# Altium footprint library ZYF_Common.PcbLib: 66 footprints (part 1 of 5)
Each footprint in its own frame and in the unit in brackets; x right, y up, seen from the top. Pads: shape width x height; smd on the part's side, far side on the other; paste and mask are expansions set on the pad; w line width, h text height; cw(c..) or ccw(c..) is an arc to the next point about the centre after c.
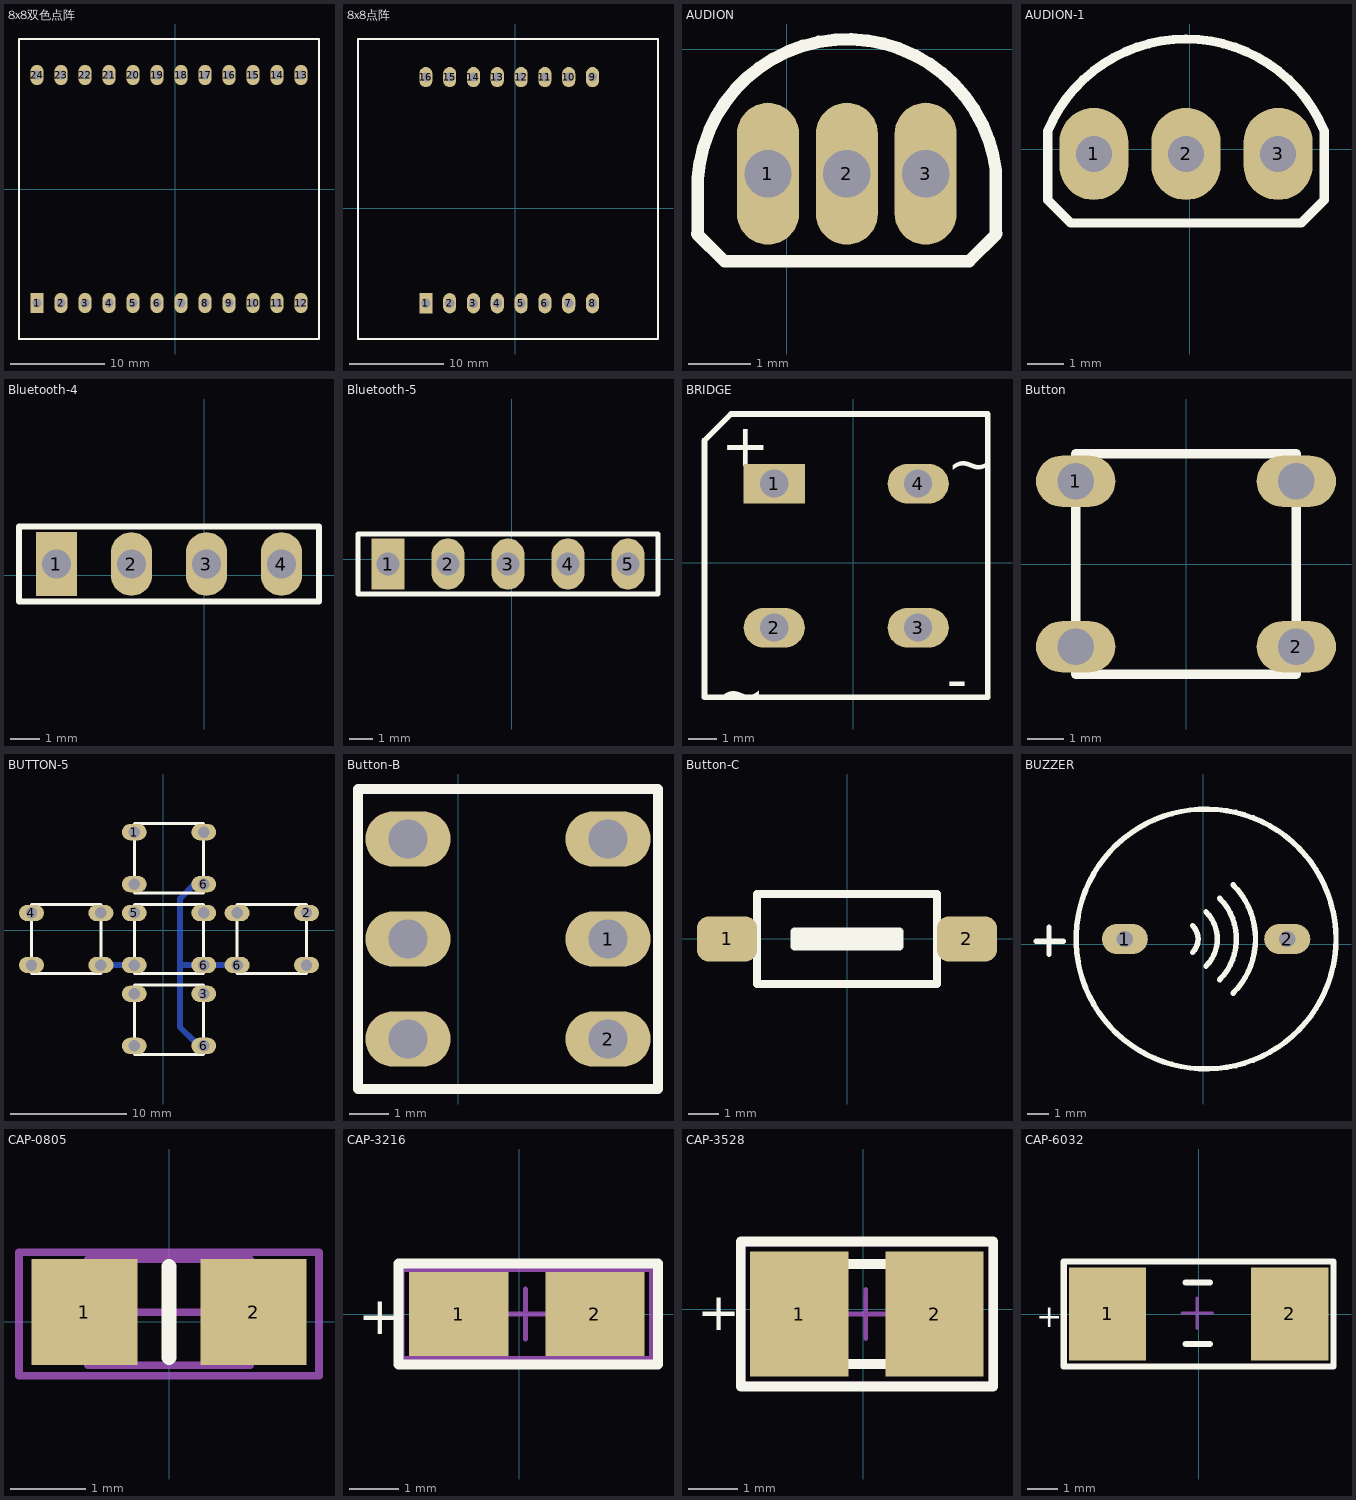
[diagram p0: the footprints below, top view; thin cyan lines are the x and y axes]

## 8x8双色点阵 [mil]
pads (24):
  rect 55x85 hole 39: 1(-575,-475)
  oval 55x85 hole 39: 2(-475,-475) 3(-375,-475) 4(-275,-475) 5(-175,-475) 6(-75,-475) 7(25,-475) 8(125,-475) 9(225,-475) 10(325,-475) 11(425,-475) 12(525,-475) 13(525,475) 14(425,475) 15(325,475) 16(225,475) 17(125,475) 18(25,475) 19(-75,475) 20(-175,475) 21(-275,475) 22(-375,475) 23(-475,475) 24(-575,475)
Top Overlay:
  lines w10: -650,-625 600,-625 600,625 -650,625 -650,-625
3D body: height 315, standoff -128, extent -657,-628.5 600,628.5

## 8x8点阵 [mil]
pads (16):
  rect 55x85 hole 39: 1(-375,-400)
  oval 55x85 hole 39: 2(-275,-400) 3(-175,-400) 4(-75,-400) 5(25,-400) 6(125,-400) 7(225,-400) 8(325,-400) 9(325,550) 10(225,550) 11(125,550) 12(25,550) 13(-75,550) 14(-175,550) 15(-275,550) 16(-375,550)
Top Overlay:
  lines w10: -660,-550 -660,710 600,710 600,-550 -660,-550
3D body: height 315, standoff -128, extent -657,-550 600,707

## AUDION [mil]
pads (3):
  oval 39.37x90 hole 30: 1(-12,-79) 2(38,-79) 3(88,-79)
Top Overlay:
  lines w7.85: -56.49,-82 cw(c38.24,-88.69) 132.49,-77
  lines w7.87: -56.88,-117.19 -39.56,-134.51 115.56,-134.51 132.88,-117.19 ; -56.49,-117.19 -56.49,-82 ; 132.49,-117.19 132.49,-77
3D body: height 189.96, standoff -578.74, extent -55.7,-135.91 131.7,7

## AUDION-1 [mil]
pads (3):
  oval 75x100 hole 39: 1(-104,-5) 2(-4,-5) 3(96,-5)
Top Overlay:
  lines w10: -154,-55 -129,-80 121,-80 146,-55 146,20 ccw(c-4,-43.15) -154,20 -154,-55
3D body: height 189.96, standoff -578.74, extent -97.7,-66.91 89.7,76

## Bluetooth-4 [mil]
pads (4):
  rect 55x85 hole 39: 1(-197,15)
  oval 55x85 hole 39: 2(-97,15) 3(3,15) 4(103,15)
Top Overlay:
  lines w7.87: -247,-35 153,-35 153,65 -247,65 -247,-35
3D body: height 322.83, standoff -118.11, extent -247,-33.36 153,65

## Bluetooth-5 [mil]
pads (5):
  rect 55x85 hole 39: 1(-206,-8)
  oval 55x85 hole 39: 2(-106,-8) 3(-6,-8) 4(94,-8) 5(194,-8)
Top Overlay:
  lines w7.87: -256,-58 244,-58 244,42 -256,42 -256,-58
3D body: height 322.83, standoff -118.11, extent -252.05,-57.04 247.94,41.32

## BRIDGE [mil]
pads (4):
  rect 85x55 hole 39: 1(-110,110)
  oval 85x55 hole 39: 2(-110,-90) 3(90,-90) 4(90,110)
Top Overlay:
  lines w7.87: -206.85,-186.85 -206.85,170 -170,206.85 186.85,206.85 186.85,-186.85 -206.85,-186.85
  text "+" at -183.62,134.57 h59.06
  text "-" at 130,-190 h59.05
  text "~" at -190,-210 h59.05
  text "~" at 130,110 h59.05

## Button [mil]
pads (4):
  oval 85x55 hole 39: 1(-118.11,88.58) 2(118.11,-88.58) ""(-118.11,-88.58) ""(118.11,88.58)
Top Overlay:
  lines w10: -118.11,-118.11 118.11,-118.11 118.11,118.11 -118.11,118.11 -118.11,-118.11
3D body: height 197.24, standoff -138.19, extent -152.41,-118.7 152.43,118.7

## BUTTON-5 [mil]
pads (20):
  oval 85x55 hole 39: 1(-99.18,333.45) 2(487.04,58.45) 3(137.04,-216.55) 4(-449.18,58.45) 5(-99.18,58.45) 6(137.04,-393.71) 6(137.04,-118.71) 6(137.04,156.29) 6(250.82,-118.71) ""(-449.18,-118.71) ""(-212.96,-118.71) ""(-212.96,58.45) ""(-99.18,-393.71) ""(-99.18,-216.55) ""(-99.18,-118.71) ""(-99.18,156.29) ""(137.04,58.45) ""(137.04,333.45) ""(250.82,58.45) ""(487.04,-118.71)
Bottom Layer:
  lines w20: -212.96,-118.71 -102.48,-118.71 ; 56.43,-180.13 56.43,107.37 105.35,156.29 137.04,156.29 ; 106.43,-380.13 56.43,-330.13 56.43,-118.71 137.04,-118.71 237.52,-118.71 ; 107.52,58.45 137.04,58.45
Top Overlay:
  lines w10: -449.18,-148.24 -449.18,87.98 -212.96,87.98 -212.96,-148.24 -449.18,-148.24 ; -99.18,-423.24 -99.18,-187.02 137.04,-187.02 137.04,-423.24 -99.18,-423.24 ; -99.18,-148.24 137.04,-148.24 137.04,87.98 -99.18,87.98 -99.18,-148.24 ; -99.18,126.76 -99.18,362.98 137.04,362.98 137.04,126.76 -99.18,126.76 ; 250.82,-148.24 250.82,87.98 487.04,87.98 487.04,-148.24 250.82,-148.24
3D body: height 197.24, standoff -138.19, extent -133.48,126.17 171.36,363.57
3D body: height 197.24, standoff -138.19, extent -133.48,-423.83 171.36,-186.43
3D body: height 197.24, standoff -138.19, extent -483.48,-148.83 -178.64,88.57
3D body: height 197.24, standoff -138.19, extent 216.52,-148.83 521.36,88.57
3D body: height 197.24, standoff -138.19, extent -133.48,-148.83 171.36,88.57

## Button-B [mil]
pads (6):
  oval 85x55 hole 39: 1(150,225) 2(150,125) ""(-50,125) ""(-50,225) ""(-50,325) ""(150,325)
Top Overlay:
  lines w10: -100,75 200,75 200,375 -100,375 -100,75
3D body: height 511.81, standoff -157.48, extent -87.79,87.21 187.8,362.8

## Button-C [mm]
pads (2):
  rrect50% 2x1.5 smd: 1(-4,0) 2(4,0)
Top Overlay:
  lines w0.254: -1.75,0 1.75,0 ; -3,-1.5 3,-1.5 3,1.5 -3,1.5 -3,-1.5 ; -1.75,-0.25 1.75,-0.25 1.75,0.25 -1.75,0.25 -1.75,-0.25
3D body: height 2.5, standoff -0.1, extent -4,-1.8 4,1.8

## BUZZER [mil]
pads (2):
  oval 85x55 hole 30: 1(-145,10) 2(155,10)
Top Overlay:
  circle w10: c5,10 r240
  lines w10: -309,6 -259,6 ; -285,-18 -285,32 ; -20,-15 ccw(c-45,10) -20,35 ; 5,-40 ccw(c-45,10) 5,60 ; 30,-65 ccw(c-45,10) 30,85 ; 55,-90 ccw(c-45,10) 55,110
3D body: height 366.14, standoff -137.8, extent -231.22,-224.22 241.22,248.22

## CAP-0805 [mil]
pads (2):
  rect 55.12x55.12 smd: 1(-44,5) 2(44,5)
Top Overlay:
  lines w7.87: 0,-18.62 0,28.62
Mechanical 13:
  lines w3.94: -42.32,-22.56 -42.32,32.56 42.32,32.56 42.32,-22.56 -42.32,-22.56
Mechanical 15:
  lines w3.94: -19.68,5 19.69,5 ; 0,-14.68 0,24.69 ; -78,-28 -78,36 78,36 78,-28 -78,-28
3D body: height 47.24, standoff 0, extent -39.37,-18.62 39.37,28.62

## CAP-3216 [mm]
pads (2):
  rect 2x1.7 smd: 1(-1.223,0) 2(1.524,0)
Top Overlay:
  lines w0.2: -0.254,-1.016 0.546,-1.016 ; -0.254,1.016 0.546,1.016 ; 2.794,-1.016 -2.438,-1.016 -2.438,1.016 2.794,1.016 ; 2.794,-1.016 2.794,1.016 ; 2.794,-1.016 2.794,1.016
  text "+" at -3.251,-0.406 h0.76
Mechanical 13:
  lines w0.1: -2.362,-0.9 2.667,-0.9 2.667,0.9 -2.362,0.9 -2.362,-0.9
Mechanical 15:
  lines w0.1: -0.373,0 0.627,0 ; 0.127,-0.5 0.127,0.5 ; -2.388,-0.95 2.667,-0.95 2.667,0.95 -2.388,0.95 -2.388,-0.95
3D body: height 1.8, standoff 0, extent -1.522,-0.9 1.878,0.9

## CAP-3528 [mil]
pads (2):
  rect 78.74x100 smd: 1(-51.15,-4) 2(57,-4)
Top Overlay:
  lines w7.87: -13,-44 18.5,-44 ; -13,36 18.5,36 ; -98,-62 -98,54 104,54 104,-36 104,-62 -98,-62
  text "+" at -133,-17 h30
Mechanical 13:
  lines w3.94: -96,-60 102,-60 102,52 -96,52 -96,-60
Mechanical 15:
  lines w3.94: -17.68,-4 21.68,-4 ; 2,-23.68 2,15.69 ; -96,-60 102,-60 102,52 -96,52 -96,-60
3D body: height 79.92, standoff 0, extent -68.83,-61.67 76.84,53.68

## CAP-6032 [mil]
pads (2):
  rect 100x120 smd: 1(-118.1,0.01) 2(118.12,0.01)
Top Overlay:
  lines w7.87: -17,-39 14.5,-39 ; -17,41 14.5,41 ; -175,-68 175,-68 175,44 175,68 -175,68 -175,-68
  text "+" at -211,-17 h30
Mechanical 13:
  lines w3.94: -175,-68 -175,68 175,68 175,-68 -175,-68
Mechanical 15:
  lines w3.94: -21.68,1 17.68,1 ; -2,-18.68 -2,20.69 ; -175,-68 -175,68 175,68 175,-68 -175,-68
3D body: height 98.43, standoff 0, extent -118.1,-62.98 118.12,63